# Altium footprint library XU-GENARAL PCB .PcbLib: 1176 footprints (part 10 of 75)
Each footprint in its own frame and in the unit in brackets; x right, y up, seen from the top. Pads: shape width x height; smd on the part's side, far side on the other; paste and mask are expansions set on the pad; w line width, h text height; cw(c..) or ccw(c..) is an arc to the next point about the centre after c.
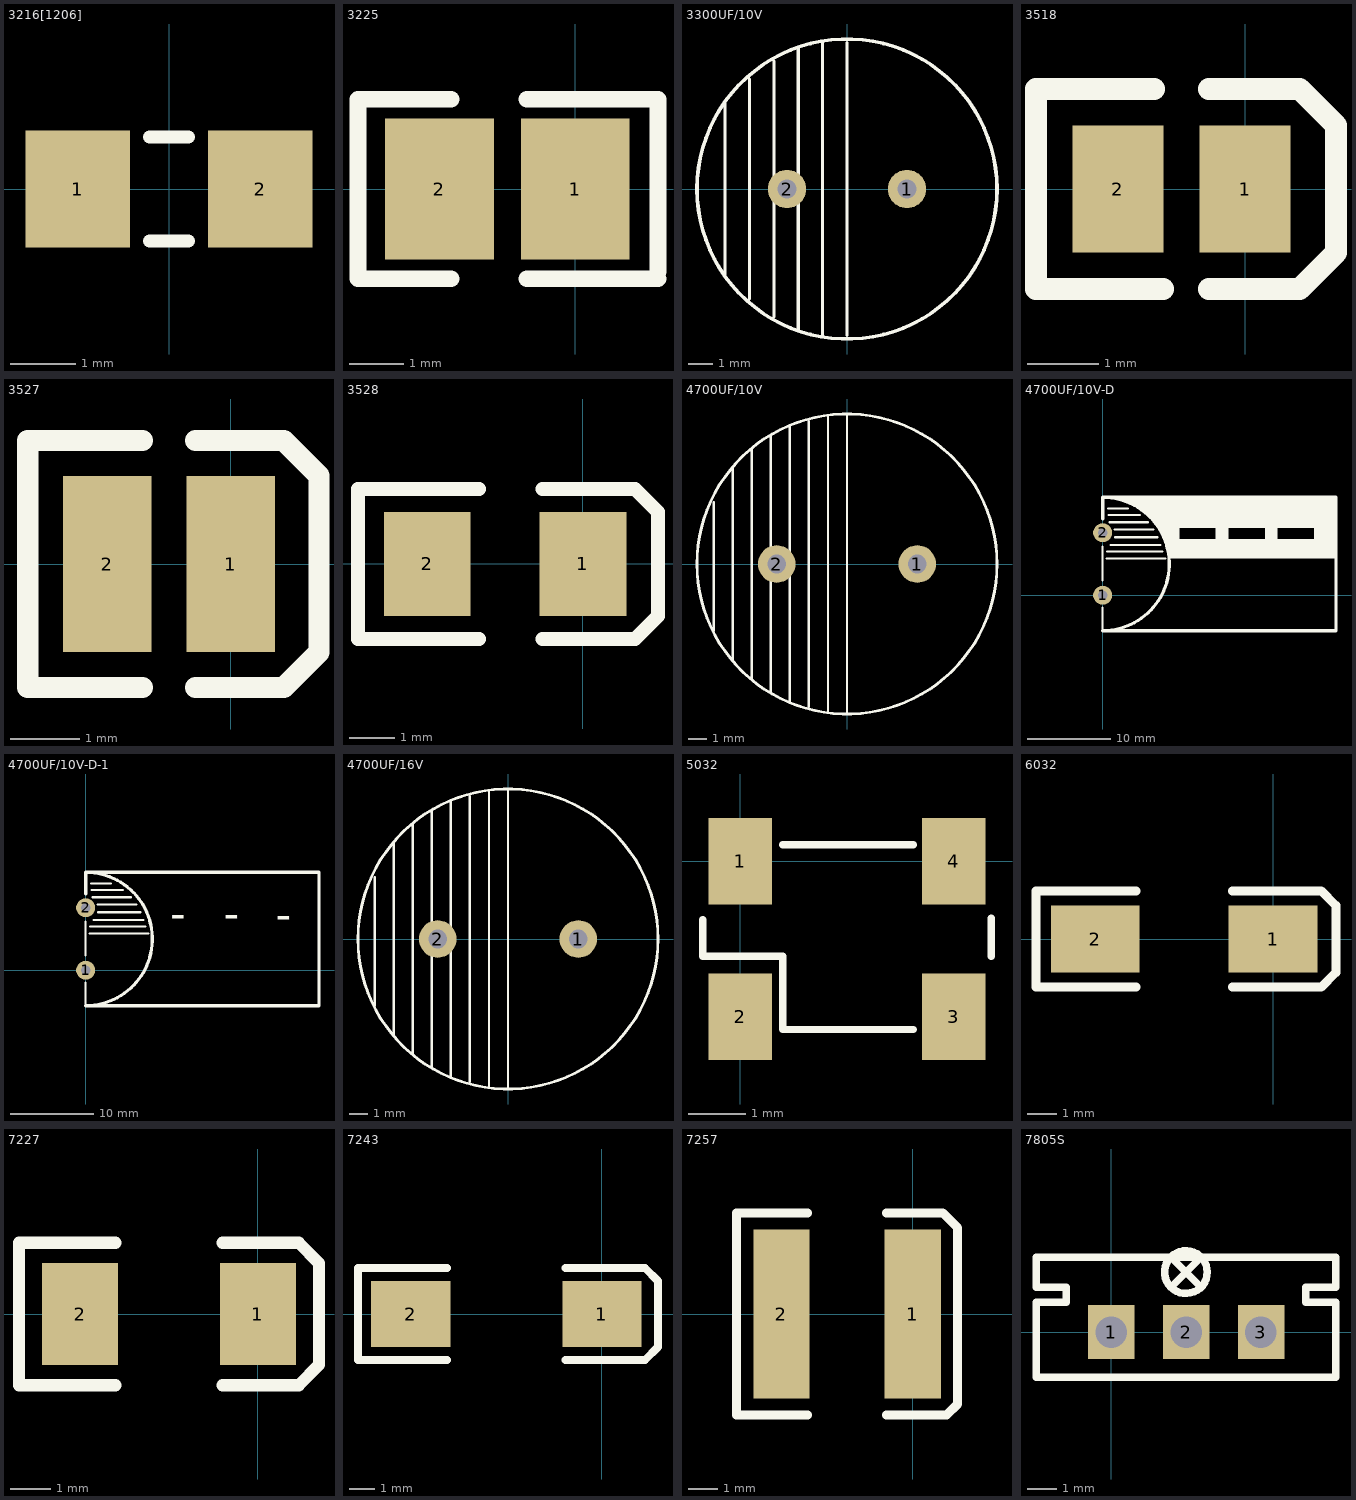
[diagram p9: the footprints below, top view; thin cyan lines are the x and y axes]

## 3216[1206] [mm]
height 1.75
pads (2):
  rect 1.6x1.8 smd: 1(-1.4,0) 2(1.4,0)
Top Overlay:
  lines w0.2: -0.3,-0.8 0.3,-0.8 ; -0.3,0.8 0.3,0.8

## 3225 [mm]
pads (2):
  rect 2x2.6 smd: 1(0,0) 2(-2.5,0)
Top Overlay:
  lines w0.305: -2.286,-1.651 -4,-1.651 -4,1.651 -2.286,1.651 ; -0.889,-1.651 1.524,-1.651 ; -0.889,1.651 1.524,1.651 1.524,-1.524

## 3300UF/10V [mm]
pads (2):
  round 1.6 hole 0.8: 1(2.5,0) 2(-2.5,0)
Top Overlay:
  circle w0.152: c0,0 r6.25
  rectangle: -2.032,-2.032 -2.032,2.032
  lines w0.127: -5.08,-3.556 -5.08,3.556 ; -4.064,-4.572 -4.064,4.572 ; -4.064,-2.794 -4.064,2.794 ; -3.048,-5.334 -3.048,5.334 ; -3.048,-3.81 -3.048,3.81 ; -2.032,-5.842 -2.032,5.842 ; -2.032,-4.572 -2.032,4.572 ; -1.016,-6.096 -1.016,6.096 ; -1.016,-4.826 -1.016,4.826 ; 0,-6.096 0,6.096 ; 0,-5.08 0,4.826

## 3518 [mil]
pads (2):
  rect 50x70 smd: 1(0,0) 2(-70,0)
Top Overlay:
  lines w12: -50,55 -115,55 -115,-55 -45,-55 ; -20,-55 30,-55 50,-35 50,35 30,55 -20,55

## 3527 [mil]
pads (2):
  rect 50x100 smd: 1(0,0) 2(-70,0)
Top Overlay:
  lines w12: -50,-70 -115,-70 -115,70 -50,70 ; -20,-70 30,-70 50,-50 50,50 30,70 -20,70

## 3528 [mil]
pads (2):
  rect 75x90 smd: 1(0,0) 2(-135,0)
Top Overlay:
  lines w12: -90,-65 -195,-65 -195,65 -90,65 ; -35,-65 45,-65 65,-45 65,45 45,65 -35,65

## 4700UF/10V [mm]
pads (2):
  round 2 hole 1: 1(3.75,0) 2(-3.75,0)
Top Overlay:
  circle w0.152: c0,0 r8
  rectangle: -2.032,-2.032 -2.032,2.032
  lines w0.127: -7.112,-3.556 -7.112,3.302 ; -6.096,-5.08 -6.096,5.08 ; -5.08,-6.096 -5.08,6.096 ; -4.064,-6.858 -4.064,6.858 ; -3.048,-7.366 -3.048,7.366 ; -2.032,-7.62 -2.032,7.62 ; -1.016,-7.874 -1.016,7.874 ; 0,-7.874 0,7.874 ; 0,-5.08 0,4.826

## 4700UF/10V-D [mil]
pads (2):
  round 90 hole 45: 1(0,0) 2(0,295.28)
Top Overlay:
  rectangle: 197,395 200,407
  rectangle: 204,386 215,402
  rectangle: 185,402 204,410
  rectangle: 170,409 197,423
  rectangle: 161,418 183,427
  rectangle: 197,395 214,409
  rectangle: 137,427 161,439
  rectangle: 126,435 158,446
  rectangle: 90,446 126,463
  rectangle: 76,453 119,463
  rectangle: 177,407 217,430
  rectangle: 150,422 215,447
  rectangle: 111,440 219,463
  rectangle: 215,372 231,386
  rectangle: 231,359 242,372
  rectangle: 224,367 241,388
  rectangle: 242,341 258,359
  rectangle: 242,348 253,359
  rectangle: 266,313 275,330
  rectangle: 258,325 275,341
  rectangle: 250,336 274,356
  rectangle: 237,352 272,392
  rectangle: 209,381 276,463
  rectangle: 283,286 290,300
  rectangle: 275,295 300,313
  rectangle: 275,300 290,313
  rectangle: 290,261 314,279
  rectangle: 288,271 308,312
  rectangle: 310,208 316,228
  rectangle: 304,222 319,234
  rectangle: 304,234 317,252
  rectangle: 298,244 321,265
  rectangle: 304,252 355,316
  rectangle: 1004,242 1102,329
  rectangle: 773,246 819,339
  rectangle: 539,244 591,325
  rectangle: 314,174 1102,261
  rectangle: 196,396 211,411
  rectangle: 196,387 214,396
  rectangle: 266,329 1102,463
  rectangle: 275,323 1040,341
  rectangle: 274,310 357.11,336
  lines w10: 0,-168 0,-58.07 ; 0,69 0,231 ; 19,174 297,174 ; 20,206 283,206 ; 25.32,410 119,410 ; 27.32,379 175,379 ; 31.56,345 215,345 ; 37,238 272,238 ; 56.56,310 240,310 ; 59.32,274 259,274 ; 357.11,260.39 357.11,321.81 538.75,321.81 538.75,260.39 357.11,260.39 ; 590.11,261.39 590.11,322.81 771.75,322.81 771.75,261.39 590.11,261.39 ; 821.11,261.39 821.11,322.81 1002.75,322.81 1002.75,261.39 821.11,261.39
  lines w15: 0,-168 1102.36,-168 1102.36,463 0,463 0,360 ; 0,-167.32 ccw(c0,147.64) 0,462.6

## 4700UF/10V-D-1 [mil]
pads (2):
  round 90 hole 45: 1(0,0) 2(0,295.28)
Top Overlay:
  lines w10: 0,-168 0,-58.07 ; 0,69 0,231 ; 19,174 297,174 ; 20,206 283,206 ; 25.32,410 119,410 ; 27.32,379 175,379 ; 31.56,345 215,345 ; 37,238 272,238 ; 56.56,310 240,310 ; 59.32,274 259,274
  lines w15: 0,-168 1102.36,-168 1102.36,463 0,463 0,360 ; 0,-167.32 ccw(c0,147.64) 0,462.6
  text "-" at 400,195 h150
  text "-" at 652,195 h150
  text "-" at 899,191 h150

## 4700UF/16V [mm]
pads (2):
  round 2 hole 1: 1(3.75,0) 2(-3.75,0)
Top Overlay:
  circle w0.152: c0,0 r8
  rectangle: -2.032,-2.032 -2.032,2.032
  lines w0.127: -7.112,-3.556 -7.112,3.302 ; -6.096,-5.08 -6.096,5.08 ; -5.08,-6.096 -5.08,6.096 ; -4.064,-6.858 -4.064,6.858 ; -3.048,-7.366 -3.048,7.366 ; -2.032,-7.62 -2.032,7.62 ; -1.016,-7.874 -1.016,7.874 ; 0,-7.874 0,7.874 ; 0,-5.08 0,4.826

## 5032 [mm]
pads (4):
  rect 1.1x1.5 smd: 1(0,0) 2(0,-2.7) 3(3.7,-2.7) 4(3.7,0)
Top Overlay:
  lines w0.127: -0.652,-1.013 -0.652,-1.648 0.737,-1.648 0.737,-2.918 2.997,-2.918 ; 0.737,0.282 2.997,0.282 ; 4.348,-1.648 4.348,-0.987

## 6032 [mil]
pads (2):
  rect 120x90 smd: 1(0,0) 2(-240,0)
Top Overlay:
  lines w12: -185,-65 -320,-65 -320,65 -185,65 ; -55,-65 65,-65 85,-45 85,45 65,65 -55,65

## 7227 [mil]
pads (2):
  rect 75x100 smd: 1(0,0) 2(-175,0)
Top Overlay:
  lines w12: -140,-70 -235,-70 -235,70 -140,70 ; -35,-70 40,-70 60,-50 60,50 40,70 -35,70

## 7243 [mil]
pads (2):
  rect 120x100 smd: 1(0,0) 2(-290,0)
Top Overlay:
  lines w12: -235,-70 -370,-70 -370,70 -235,70 ; -55,-70 65,-70 85,-50 85,50 65,70 -55,70

## 7257 [mil]
pads (2):
  rect 75x225 smd: 1(0,0) 2(-175,0)
Top Overlay:
  lines w12: -140,-135 -235,-135 -235,135 -140,135 ; -35,-135 45,-135 60,-120 60,115 40,135 -35,135

## 7805S [mil]
pads (3):
  rect 62x72 hole 42: 1(0,0) 2(100,0) 3(200,0)
Top Overlay:
  circle w10: c99.9,80.1 r28.43
  lines w10: 80,60 120,100 ; 80,100 120,60 ; -100,-60 300,-60 300,40 260,40 260,60 300,60 300,100 -100,100 -100,60 -60,60 -60,40 -100,40 -100,-60